# Altium footprint library Conectores.PcbLib: 122 footprints (part 2 of 8)
Each footprint in its own frame and in the unit in brackets; x right, y up, seen from the top. Pads: shape width x height; smd on the part's side, far side on the other; paste and mask are expansions set on the pad; w line width, h text height; cw(c..) or ccw(c..) is an arc to the next point about the centre after c.
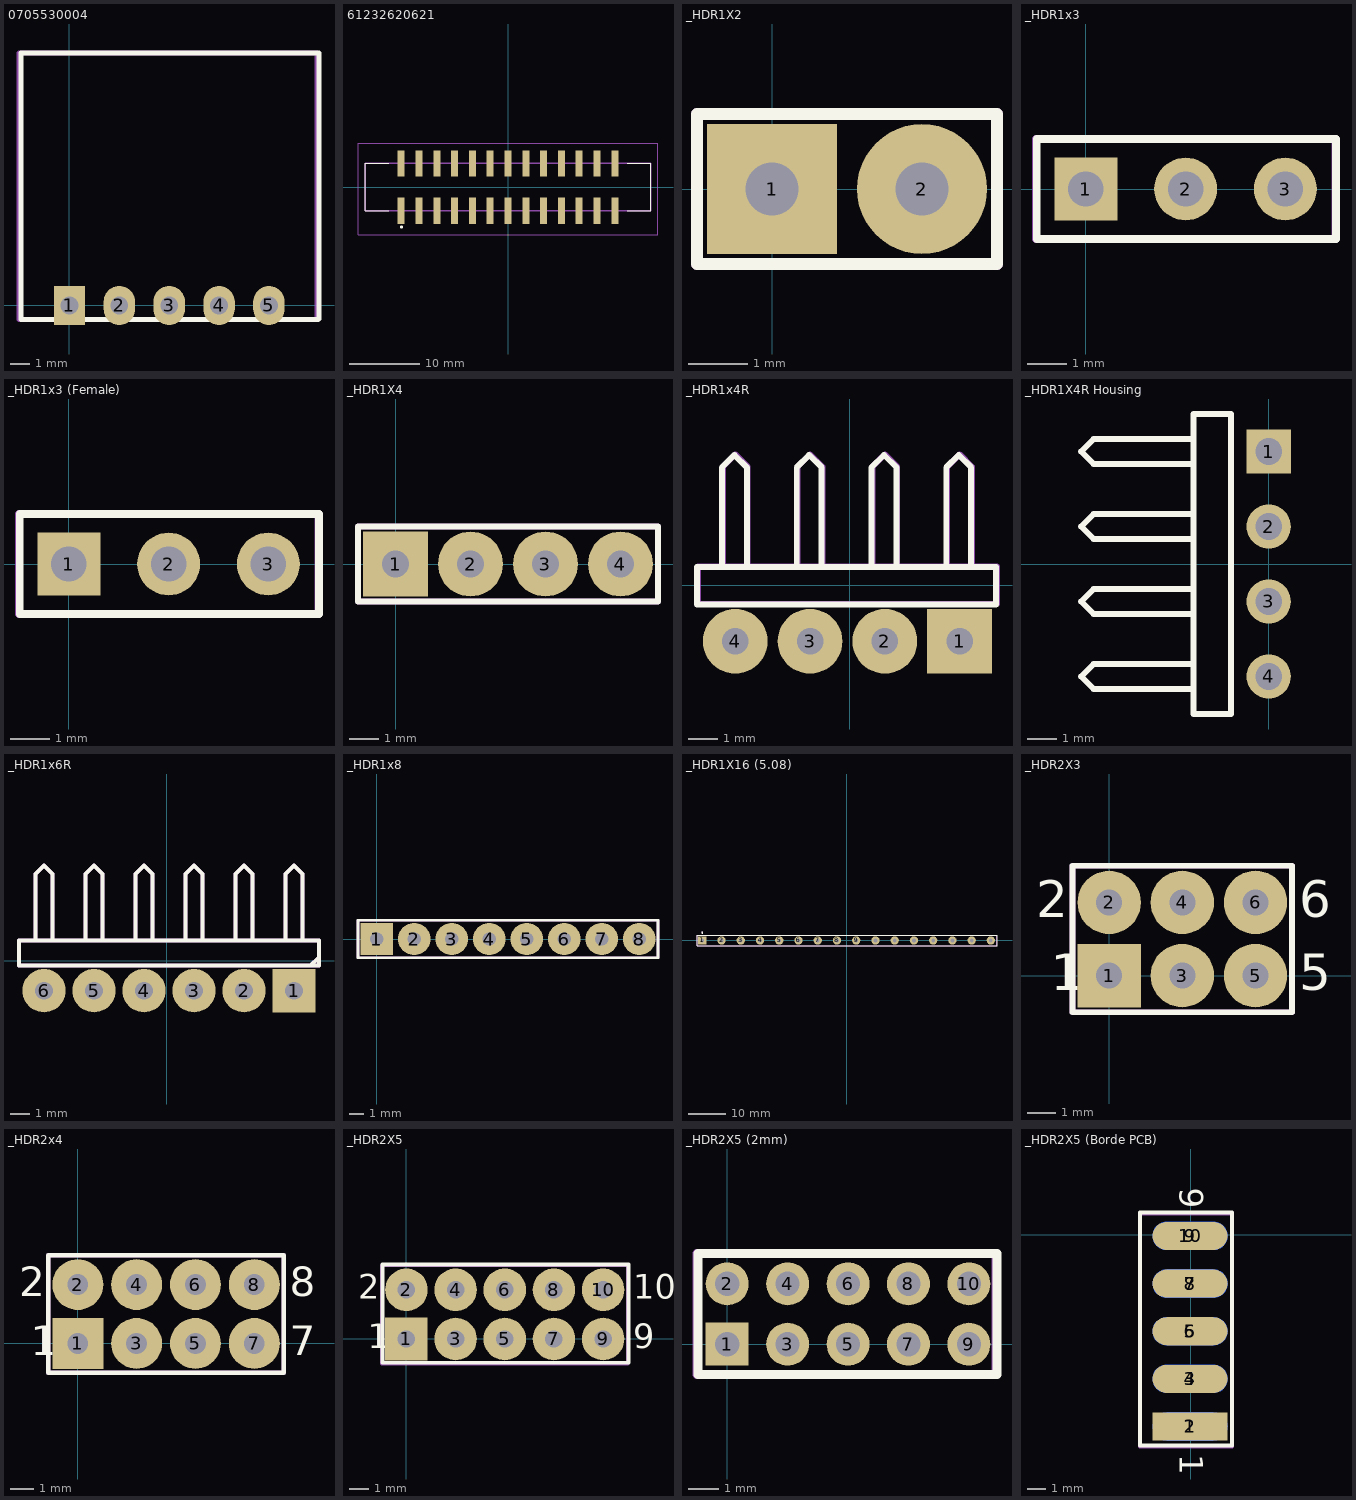
[diagram p1: the footprints below, top view; thin cyan lines are the x and y axes]

## 0705530004 [mm] "CONN HEADER 5POS .100 R/A GOLD"
pads (5):
  rect 1.6x2 hole 0.9: 1(0,0)
  oval 1.6x2 hole 0.9: 2(2.54,0) 3(5.08,0) 4(7.62,0) 5(10.16,0)
Top Overlay:
  lines w0.254: -2.48,-0.72 -2.48,12.85 -2.47,12.86 12.71,12.86 12.7,12.85 12.7,-0.68 12.66,-0.72 -2.48,-0.72
Mechanical 29:
  lines w0.254: -2.57,-0.72 12.57,-0.72 12.61,-0.68 12.61,12.85 12.62,12.86 -2.56,12.86 -2.57,12.85 -2.57,-0.72
  text "'.Designator'" at 5.14,1.91 h0.5
  text "1" at -0.04,1.63 h0.8
3D body "705530004.stp": height 7.06, standoff -3.22, extent -2.59,-0.704 12.65,12.885

## 61232620621 [mm] "Header SMD 2x26 2.54mm"
pads (26):
  rect 1x3.75 smd: 1(-15.24,-3.375) 2(-15.24,3.375) 3(-12.7,-3.375) 4(-12.7,3.375) 5(-10.16,-3.375) 6(-10.16,3.375) 7(-7.62,-3.375) 8(-7.62,3.375) 9(-5.08,-3.375) 10(-5.08,3.375) 11(-2.54,-3.375) 12(-2.54,3.375) 13(0,-3.375) 14(0,3.375) 15(2.54,-3.375) 16(2.54,3.375) 17(5.08,-3.375) 18(5.08,3.375) 19(7.62,-3.375) 20(7.62,3.375) 21(10.16,-3.375) 22(10.16,3.375) 23(12.7,-3.375) 24(12.7,3.375) 25(15.24,-3.375) 26(15.24,3.375)
Top Overlay:
  lines w0.1: -17,-3.375 -20.41,-3.375 -20.41,3.375 -17,3.375 ; 17,-3.375 20.41,-3.375 20.41,3.375 17,3.375
  lines w0.2: -15.3,-5.7 cw(c-15.2,-5.7) -15.1,-5.7 cw(c-15.2,-5.7) -15.3,-5.7
Mechanical 15:
  lines w0.2: -20.41,-3.375 20.41,-3.375 20.41,3.375 -20.41,3.375 -20.41,-3.375
Mechanical 20:
  lines w0.1: -21.41,-6.8 21.41,-6.8 21.41,6.25 -21.41,6.25 -21.41,-6.8
3D body "61232620621 (rev1).stp": height 10.25, standoff -0.26, extent -20.37,-4.71 20.27,4.79

## _HDR1X2 [mm]
pads (2):
  rect 2.2x2.2 hole 0.9: 1(0,0)
  round 2.2 hole 0.9: 2(2.54,0)
Top Overlay:
  lines w0.2: -1.27,-1.27 -1.27,1.27 3.81,1.27 3.81,-1.27 -1.27,-1.27
Mechanical 29:
  lines w0.2: -1.27,-1.27 3.81,-1.27 3.81,1.27 -1.27,1.27 -1.27,-1.27
  text "1" at -0.16,1.62 h0.8
  text "'.Designator'" at -0.358,-2.102 h0.5
3D body "_HDR1x2.STEP": height 10.1, standoff -1.5, extent -1.27,-1.27 3.81,1.27

## _HDR1x3 [mm]
pads (3):
  rect 1.6x1.6 hole 0.9: 1(0,0)
  round 1.6 hole 0.9: 2(2.54,0) 3(5.08,0)
Top Overlay:
  lines w0.2: -1.25,-1.27 6.37,-1.27 6.37,1.27 -1.25,1.27 -1.25,-1.27
Mechanical 29:
  lines w0.2: -1.27,-1.27 -1.27,1.27 6.35,1.27 6.35,-1.27 -1.27,-1.27
  text "'.Designator'" at -0.388,-2.132 h0.5
  text "1" at -0.23,1.67 h0.8
3D body "_HDR1x3.STEP": height 10.1, standoff -1.5, extent -1.27,-1.245 6.35,1.295

## _HDR1x3 (Female) [mm]
pads (3):
  rect 1.6x1.6 hole 0.9: 1(0,0)
  round 1.6 hole 0.9: 2(2.54,0) 3(5.08,0)
Top Overlay:
  lines w0.2: -1.25,-1.27 -1.25,1.27 6.37,1.27 6.37,-1.27 -1.25,-1.27
Mechanical 29:
  lines w0.2: -1.27,-1.27 6.35,-1.27 6.35,1.27 -1.27,1.27 -1.27,-1.27
  text "1" at -0.23,1.67 h0.8
  text "'.Designator'" at -0.388,-2.132 h0.5
3D body "_HDR1x3 (Female).step": height 8.42, standoff -3.13, extent -1.22,-1.21 6.4,1.29

## _HDR1X4 [mm]
pads (4):
  rect 2.2x2.2 hole 0.9: 1(0,0)
  round 2.2 hole 0.9: 2(2.54,0) 3(5.08,0) 4(7.62,0)
Top Overlay:
  lines w0.2: -1.27,-1.27 8.89,-1.27 8.89,1.27 -1.27,1.27 -1.27,-1.27
Mechanical 29:
  lines w0.2: -1.27,-1.27 -1.27,1.27 8.89,1.27 8.89,-1.27 -1.27,-1.27
  text "'.Designator'" at -0.538,-0.232 h0.5
  text "1" at -0.12,1.68 h0.8
3D body "_HDR1x4.STEP": height 10.12, standoff -1.48, extent -1.27,-1.27 8.89,1.27

## _HDR1x4R [mm] "Regleta de pines a 90 grados x 4"
pads (4):
  rect 2.2x2.2 hole 0.9: 1(3.729,-1.905)
  round 2.2 hole 0.9: 2(1.189,-1.905) 3(-1.351,-1.905) 4(-3.891,-1.905)
Top Overlay:
  lines w0.2: -4.344,0.615 -4.344,4.002 -3.921,4.425 -3.498,4.002 -3.498,0.615 ; -1.804,0.615 -1.804,4.002 -1.381,4.425 -0.958,4.002 -0.958,0.615 ; 0.736,0.615 0.736,4.002 1.159,4.425 1.582,4.002 1.582,0.615 ; 3.276,0.615 3.276,4.002 3.699,4.425 4.122,4.002 4.122,0.615 ; -5.191,-0.655 -5.191,0.615 4.969,0.615 4.969,-0.655 -5.191,-0.655
Mechanical 29:
  lines w0.2: -4.314,0.635 -4.314,4.022 -3.891,4.445 -3.468,4.022 -3.468,0.635 ; -1.774,0.635 -1.774,4.022 -1.351,4.445 -0.928,4.022 -0.928,0.635 ; 0.766,0.635 0.766,4.022 1.189,4.445 1.612,4.022 1.612,0.635 ; 3.306,0.635 3.306,4.022 3.729,4.445 4.152,4.022 4.152,0.635 ; -5.161,-0.635 4.999,-0.635 4.999,0.635 -5.161,0.635 -5.161,-0.635
  text "1" at 3.69,-4.19 h0.8
  text "'.Designator'" at 0.42,0.21 h0.5
3D body "HDR1x4R.step": height 2.75, standoff -1.75, extent -5.207,-2.159 4.953,8.161

## _HDR1X4R Housing [mm] "WR-WTB 2.54mm Male 4Pin RtAgld TopLckg"
pads (4):
  rect 1.5x1.5 hole 0.9: 1(0,3.81)
  round 1.5 hole 0.9: 2(0,1.27) 3(0,-1.27) 4(0,-3.81)
Top Overlay:
  lines w0.2: -2.54,-4.233 -5.927,-4.233 -6.35,-3.81 -5.927,-3.387 -2.54,-3.387 ; -2.54,-1.693 -5.927,-1.693 -6.35,-1.27 -5.927,-0.847 -2.54,-0.847 ; -2.54,0.847 -5.927,0.847 -6.35,1.27 -5.927,1.693 -2.54,1.693 ; -2.54,3.387 -5.927,3.387 -6.35,3.81 -5.927,4.233 -2.54,4.233 ; -2.54,-5.08 -2.54,5.08 -1.27,5.08 -1.27,-5.08 -2.54,-5.08
3D body "71072042.stp": height 5.9, standoff -2.3, extent -13.25,-5.08 0.27,5.08

## _HDR1x6R [mm]
pads (6):
  rect 2.2x2.2 hole 0.9: 1(6.477,-1.524)
  round 2.2 hole 0.9: 2(3.937,-1.524) 3(1.397,-1.524) 4(-1.143,-1.524) 5(-3.683,-1.524) 6(-6.223,-1.524)
Top Overlay:
  lines w0.2: -6.646,1.016 -6.646,4.403 -6.223,4.826 -5.8,4.403 -5.8,1.016 ; -4.106,1.016 -4.106,4.403 -3.683,4.826 -3.26,4.403 -3.26,1.016 ; -1.566,1.016 -1.566,4.403 -1.143,4.826 -0.72,4.403 -0.72,1.016 ; 0.974,1.016 0.974,4.403 1.397,4.826 1.82,4.403 1.82,1.016 ; 3.514,1.016 3.514,4.403 3.937,4.826 4.36,4.403 4.36,1.016 ; 6.054,1.016 6.054,4.403 6.477,4.826 6.9,4.403 6.9,1.016 ; 7.324,-0.254 7.747,0.169 ; -7.493,-0.254 7.747,-0.254 7.747,1.016 -7.493,1.016 -7.493,-0.254
Mechanical 29:
  lines w0.2: -6.646,1.016 -6.646,4.403 -6.223,4.826 -5.8,4.403 -5.8,1.016 ; -4.106,1.016 -4.106,4.403 -3.683,4.826 -3.26,4.403 -3.26,1.016 ; -1.566,1.016 -1.566,4.403 -1.143,4.826 -0.72,4.403 -0.72,1.016 ; 0.974,1.016 0.974,4.403 1.397,4.826 1.82,4.403 1.82,1.016 ; 3.514,1.016 3.514,4.403 3.937,4.826 4.36,4.403 4.36,1.016 ; 6.054,1.016 6.054,4.403 6.477,4.826 6.9,4.403 6.9,1.016 ; 7.324,-0.254 7.747,0.169 ; -7.493,-0.254 -7.493,1.016 7.747,1.016 7.747,-0.254 -7.493,-0.254
  text "'.Designator'" at 0.34,0.61 h0.5
  text "1" at 6.69,-3.3 h0.8
3D body "HDR1x6R.step": height 2.55, standoff -4.77, extent -7.493,-2.794 7.747,5.476

## _HDR1x8 [mm]
pads (8):
  rect 2.2x2.2 hole 0.9: 1(0,0)
  round 2.2 hole 0.9: 2(2.54,0) 3(5.08,0) 4(7.62,0) 5(10.16,0) 6(12.7,0) 7(15.24,0) 8(17.78,0)
Top Overlay:
  lines w0.2: -1.27,-1.27 19.05,-1.27 19.05,1.27 -1.27,1.27 -1.27,-1.27
Mechanical 29:
  lines w0.2: -1.27,-1.27 -1.27,1.27 19.05,1.27 19.05,-1.27 -1.27,-1.27
  text "1" at -0.14,1.71 h0.8
  text "'.Designator'" at 2.32,-0.19 h0.5
3D body "HDR1X8.step": height 10.1, standoff -1.5, extent -1.27,-1.27 19.05,1.27

## _HDR1X16 (5.08) [mm] "5.08 DE PITCH"
pads (16):
  rect 2.2x2.2 hole 0.99: 1(-38.1,0)
  round 2.2 hole 0.99: 2(-33.02,0) 3(-27.94,0) 4(-22.86,0) 5(-17.78,0) 6(-12.7,0) 7(-7.62,0) 8(-2.54,0) 9(2.54,0) 10(7.62,0) 11(12.7,0) 12(17.78,0) 13(22.86,0) 14(27.94,0) 15(33.02,0) 16(38.1,0)
Top Overlay:
  circle w0.25: c-38.08,2.05 r0.125
  lines w0.2: -39.48,-1.4 39.72,-1.4 39.72,1.4 -39.48,1.4 -39.48,-1.4
Mechanical 29:
  circle w0.25: c-38.1,2.05 r0.125
  lines w0.2: -39.5,-1.4 -39.5,1.4 39.7,1.4 39.7,-1.4 -39.5,-1.4
  text "'.Designator'" at -38.638,-0.232 h0.5
3D body "Pins 5.08p.STEP": height 1.55, standoff -7.95, extent -38.938,-0.85 38.962,0.85

## _HDR2X3 [mm] "Regleta de pines 0.1 in de pitch"
pads (6):
  rect 2.2x2.2 hole 0.9: 1(0,0)
  round 2.2 hole 0.9: 2(0,2.54) 3(2.54,0) 4(2.54,2.54) 5(5.08,0) 6(5.08,2.54)
Top Overlay:
  lines w0.2: 1.482,-1.27 6.35,-1.27 ; 6.35,-1.27 -1.27,-1.27 -1.27,3.81 6.35,3.81 6.35,-1.27
  text "1" at -2.032,-0.508 h1.27
  text "2" at -2.54,2.032 h1.27
  text "5" at 6.604,-0.508 h1.27
  text "6" at 6.604,2.032 h1.27
Mechanical 29:
  lines w0.2: 1.482,-1.27 6.35,-1.27 ; 6.35,-1.27 6.35,3.81 -1.27,3.81 -1.27,-1.27 6.35,-1.27
  text "'.Designator'" at -0.098,1.148 h0.5
  text "6" at 6.604,2.032 h1.27
  text "5" at 6.604,-0.508 h1.27
  text "2" at -2.54,2.032 h1.27
  text "1" at -2.032,-0.508 h1.27
3D body "_HDR2x3.STEP": height 10.1, standoff -1.5, extent -1.27,-1.27 6.35,3.81

## _HDR2x4 [mm]
pads (8):
  rect 2.2x2.2 hole 0.9: 1(0,0)
  round 2.2 hole 0.9: 2(0,2.54) 3(2.54,0) 4(2.54,2.54) 5(5.08,0) 6(5.08,2.54) 7(7.62,0) 8(7.62,2.54)
Top Overlay:
  lines w0.2: -1.27,-1.27 -1.27,3.81 8.89,3.81 8.89,-1.27 -1.27,-1.27
  text "8" at 9.144,2.032 h1.27
  text "7" at 9.144,-0.508 h1.27
  text "1" at -2.032,-0.508 h1.27
  text "2" at -2.54,2.032 h1.27
Mechanical 29:
  lines w0.2: -1.27,-1.27 8.89,-1.27 8.89,3.81 -1.27,3.81 -1.27,-1.27
  text "'.Designator'" at -0.538,-0.232 h0.5
  text "2" at -2.54,2.032 h1.27
  text "1" at -2.032,-0.508 h1.27
  text "7" at 9.144,-0.508 h1.27
  text "8" at 9.144,2.032 h1.27
3D body "_HDR2x4.STEP": height 10.1, standoff -1.5, extent -1.245,-1.27 8.915,3.81

## _HDR2X5 [mm] "2 Filas 5 pines"
pads (10):
  rect 2.2x2.2 hole 0.9: 1(0,0)
  round 2.2 hole 0.9: 2(0,2.54) 3(2.54,0) 4(2.54,2.54) 5(5.08,0) 6(5.08,2.54) 7(7.62,0) 8(7.62,2.54) 9(10.16,0) 10(10.16,2.54)
Top Overlay:
  lines w0.2: -1.23,-1.23 -1.23,3.85 11.47,3.85 11.47,-1.23 -1.23,-1.23
  text "2" at -2.5,2.072 h1.27
  text "1" at -1.992,-0.468 h1.27
  text "9" at 11.724,-0.468 h1.27
  text "10" at 11.724,2.072 h1.27
Mechanical 29:
  lines w0.2: -1.27,-1.27 11.43,-1.27 11.43,3.81 -1.27,3.81 -1.27,-1.27
  text "'.Designator'" at -0.538,-0.232 h0.5
  text "10" at 11.684,2.032 h1.27
  text "9" at 11.684,-0.508 h1.27
  text "1" at -2.032,-0.508 h1.27
  text "2" at -2.54,2.032 h1.27
3D body "HDR2x5.step": height 10.1, standoff -1.5, extent -1.3,-1.25 11.4,3.83

## _HDR2X5 (2mm) [mil] "2 mm"
pads (10):
  rect 56x56 hole 31.5: 1(0,0)
  round 56 hole 31.5: 2(0,78.74) 3(78.74,0) 4(78.74,78.74) 5(157.48,0) 6(157.48,78.74) 7(236.22,0) 8(236.22,78.74) 9(314.96,0) 10(314.96,78.74)
Top Overlay:
  lines w11.81: -38.19,-39.37 351.57,-39.37 351.57,118.11 -38.19,118.11 -38.19,-39.37
Mechanical 29:
  lines w11.81: -39.37,-39.37 -39.37,118.11 350.39,118.11 350.39,-39.37 -39.37,-39.37
  text "1" at -6.69,-87.4 h31.5
  text "'.Designator'" at -21.17,-9.13 h19.68
3D body "877581016.stp": height 216.54, standoff -102.36, extent -39.37,-39.37 350.39,118.11

## _HDR2X5 (Borde PCB) [mm] "2 Filas 5 pines para conector hembra"
pads (10):
  rect 4x1.5 smd: 1(-0.025,-10.211)
  oval 4x1.5 smd far side: 2(-0.025,-10.211) 4(-0.025,-7.671) 6(-0.025,-5.131) 8(-0.025,-2.591) 10(-0.025,-0.051)
  oval 4x1.5 smd: 3(-0.025,-7.671) 5(-0.025,-5.131) 7(-0.025,-2.591) 9(-0.025,-0.051)
Top Overlay:
  lines w0.2: -2.692,-11.228 -2.692,1.193 2.21,1.193 2.21,-11.228 -2.692,-11.228
  text "9" at -0.584,2.514 h1.27
  text "1" at -0.584,-11.685 h1.27
Mechanical 29:
  lines w0.2: -2.692,-11.278 2.21,-11.278 2.21,1.143 -2.692,1.143 -2.692,-11.278
  text "'.Designator'" at -0.272,0.548 h0.5
  text "1" at -0.584,-11.735 h1.27
  text "9" at -0.584,2.464 h1.27